# Altium footprint library MyPcbLib.PcbLib: 657 footprints (part 21 of 42)
Each footprint in its own frame and in the unit in brackets; x right, y up, seen from the top. Pads: shape width x height; smd on the part's side, far side on the other; paste and mask are expansions set on the pad; w line width, h text height; cw(c..) or ccw(c..) is an arc to the next point about the centre after c.
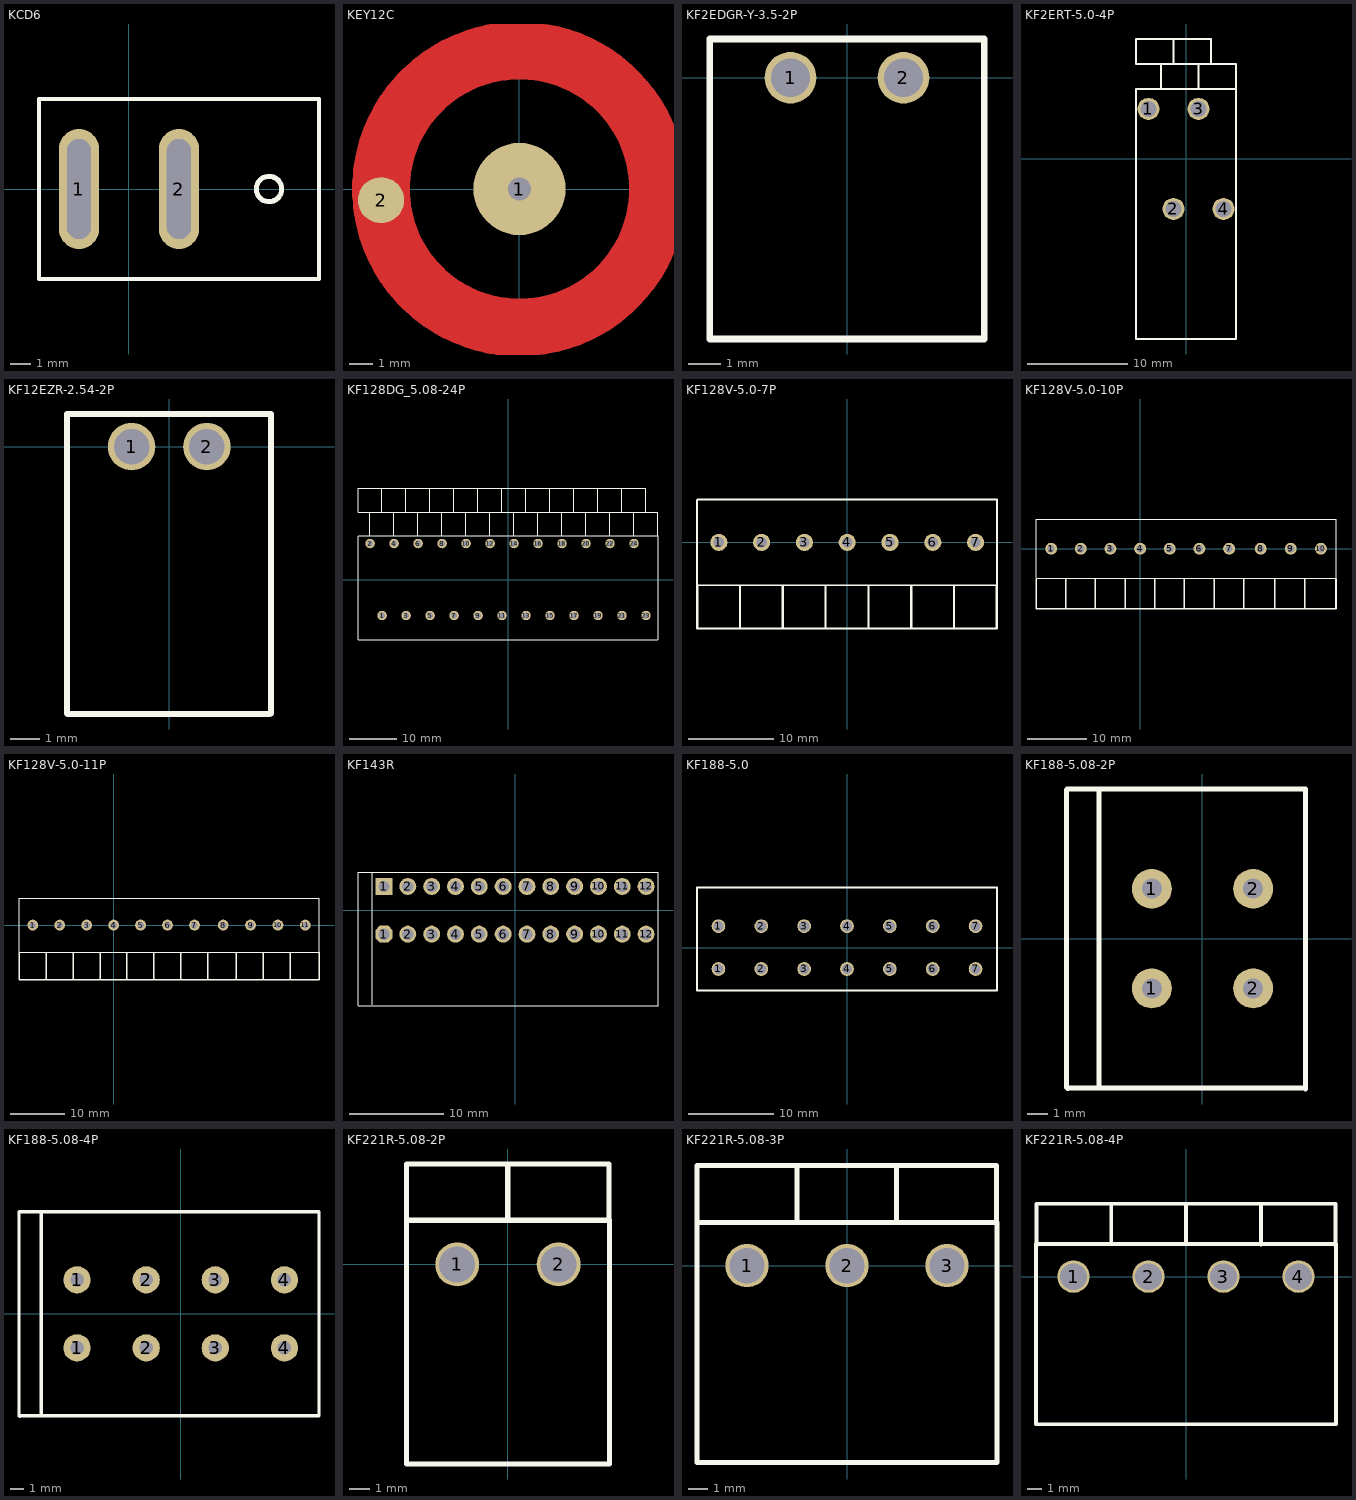
[diagram p20: the footprints below, top view; thin cyan lines are the x and y axes]

## KCD6 [mm]
pads (2):
  oval 2x6 hole 1.2 slot 5 at 90 deg: 1(-2.5,0) 2(2.5,0)
Top Overlay:
  circle w0.254: c7,0 r0.635
  lines w0.203: -4.5,-4.5 -4.5,4.5 9.5,4.5 9.5,-4.5 -4.5,-4.5

## KEY12C [mm]
pads (2):
  round 4 hole 1: 1(0,0)
  round 2 smd: 2(-5.994,-0.483)
Top Layer:
  circle w2.5: c0,0 r6
Top Solder:
  circle w2.5: c0,0 r6

## KF2EDGR-Y-3.5-2P [mm]
pads (2):
  round 1.6 hole 1.2: 1(-1.75,0) 2(1.75,0)
Top Overlay:
  lines w0.203: -4.25,1.2 -4.25,-8.1 4.25,-8.1 4.25,1.2 ; -4.242,1.2 4.216,1.2

## KF2ERT-5.0-4P [mm]
pads (4):
  round 2.2 hole 1.6: 1(-3.75,5) 2(-1.25,-5) 3(1.25,5) 4(3.75,-5)
Top Overlay:
  lines w0.203: -5.004,9.485 -5.004,11.985 ; -4.978,9.485 5,9.485 ; -4.978,11.989 2.502,11.989 ; -2.502,7.01 -2.502,9.485 ; -1.251,9.485 -1.251,11.913 ; 1.251,7.036 1.251,9.51 ; 2.502,9.485 2.502,11.887 ; 5,6.934 5,-18 -5,-18 -5,7 5,7 ; 5.004,6.934 5.004,9.485

## KF12EZR-2.54-2P [mm]
pads (2):
  round 1.6 hole 1.2: 1(-1.27,0) 2(1.27,0)
Top Overlay:
  lines w0.203: -3.454,1.092 3.404,1.092 ; -3.44,-9 -3.44,1.1 ; -3.429,-9.017 3.378,-9.017 ; 3.44,-9 3.44,1.1

## KF128DG_5.08-24P [mm]
pads (24):
  round 2 hole 1.2: 1(-26.67,-7.62) 2(-29.21,7.62) 3(-21.59,-7.62) 4(-24.13,7.62) 5(-16.51,-7.62) 6(-19.05,7.62) 7(-11.43,-7.62) 8(-13.97,7.62) 9(-6.35,-7.62) 10(-8.89,7.62) 11(-1.27,-7.62) 12(-3.81,7.62) 13(3.81,-7.62) 14(1.27,7.62) 15(8.89,-7.62) 16(6.35,7.62) 17(13.97,-7.62) 18(11.43,7.62) 19(19.05,-7.62) 20(16.51,7.62) 21(24.13,-7.62) 22(21.59,7.62) 23(29.21,-7.62) 24(26.67,7.62)
Top Overlay:
  lines w0.203: -31.775,-12.78 31.75,-12.78 ; -31.775,9.195 -31.775,-12.776 -31.75,-12.802 ; -31.775,9.22 31.75,9.22 ; -31.775,14.275 31.725,14.275 ; -31.775,14.3 -31.775,19.38 29.185,19.38 29.185,14.3 ; -29.235,9.22 -29.235,14.3 ; -26.695,14.3 -26.695,19.38 ; -24.155,9.22 -24.155,14.3 ; -21.615,14.3 -21.615,19.38 ; -19.075,9.22 -19.075,14.3 ; -16.535,14.3 -16.535,19.38 ; -13.995,9.22 -13.995,14.3 ; -11.455,14.3 -11.455,19.38 ; -8.915,9.22 -8.915,14.3 ; -6.375,14.3 -6.375,19.38 ; -3.835,9.22 -3.835,14.3 ; -1.295,14.3 -1.295,19.38 ; 1.245,9.22 1.245,14.3 ; 3.785,14.3 3.785,19.38 ; 6.325,9.22 6.325,14.3 ; 8.865,14.3 8.865,19.38 ; 11.405,9.22 11.405,14.3 ; 13.945,14.3 13.945,19.38 ; 16.485,9.22 16.485,14.3 ; 19.025,14.3 19.025,19.38 ; 21.565,9.22 21.565,14.3 ; 24.105,14.3 24.105,19.38 ; 26.645,9.22 26.645,14.3 ; 31.725,9.22 31.725,14.3 ; 31.75,-12.725 31.75,9.246
3D body: height 25.5, standoff -1.5, extent -32.522,-13.084 32.817,8.916

## KF128V-5.0-7P [mm]
pads (7):
  round 2 hole 1.2: 1(-15,0) 2(-10,0) 3(-5,0) 4(0,0) 5(5,0) 6(10,0) 7(15,0)
Top Overlay:
  lines w0.203: -17.551,-4.928 -17.551,4.953 ; -17.5,-5 17.5,-5 ; -17.5,5 17.5,5 ; 17.501,-4.953 17.501,4.953
  lines w0.254: -17.525,-5.055 -17.525,-10.055 17.475,-10.055 17.475,-5.055 ; -12.525,-10.055 -12.525,-5.055 ; -7.525,-10.055 -7.525,-5.055 ; -2.525,-10.055 -2.525,-5.055 ; 2.475,-10.055 2.475,-5.055 ; 7.475,-10.055 7.475,-5.055 ; 12.475,-10.055 12.475,-5.055
3D body: height 14.2, standoff -1.8, extent -17.653,-5.004 17.907,4.996

## KF128V-5.0-10P [mm]
pads (10):
  round 2 hole 1.2: 1(-15,0) 2(-10,0) 3(-5,0) 4(0,0) 5(5,0) 6(10,0) 7(15,0) 8(20.32,0) 9(25.4,0) 10(30.48,0)
Top Overlay:
  lines w0.203: -17.551,-4.928 -17.551,4.953 ; -17.5,-5 33.02,-5 33.02,5 -17.5,5
  lines w0.254: -17.525,-5.055 -17.525,-10.16 33.02,-10.16 ; -12.525,-10.055 -12.525,-5.055 ; -7.525,-10.055 -7.525,-5.055 ; -2.525,-10.055 -2.525,-5.055 ; 2.475,-10.055 2.475,-5.055 ; 7.475,-10.055 7.475,-5.055 ; 12.475,-10.055 12.475,-5.055 ; 17.475,-10.16 17.475,-5.055 ; 22.715,-10.055 22.715,-5.055 ; 27.715,-10.055 27.715,-5.055 ; 33.02,-10.055 33.02,-5.055
3D body: height 14.2, standoff -1.8, extent -17.653,-5.004 17.907,4.996

## KF128V-5.0-11P [mm]
pads (11):
  round 2 hole 1.2: 1(-15,0) 2(-10,0) 3(-5,0) 4(0,0) 5(5,0) 6(10,0) 7(15,0) 8(20.32,0) 9(25.4,0) 10(30.48,0) 11(35.56,0)
Top Overlay:
  lines w0.203: -17.551,-4.928 -17.551,4.953 ; -17.5,-5 38.1,-5 38.1,5 -17.5,5
  lines w0.254: -17.525,-5.055 -17.525,-10.16 38.1,-10.16 38.1,-5.055 ; -12.525,-10.055 -12.525,-5.055 ; -7.525,-10.055 -7.525,-5.055 ; -2.525,-10.055 -2.525,-5.055 ; 2.475,-10.055 2.475,-5.055 ; 7.475,-10.055 7.475,-5.055 ; 12.475,-10.055 12.475,-5.055 ; 17.475,-10.16 17.475,-5.055 ; 22.715,-10.055 22.715,-5.055 ; 27.715,-10.055 27.715,-5.055 ; 27.795,-10.055 27.795,-5.055 ; 32.795,-10.055 32.795,-5.055
3D body: height 14.2, standoff -1.8, extent -17.653,-5.004 17.907,4.996

## KF143R [mm]
pads (24):
  oct 1.8x1.8 hole 1.2 unplated: 1(-13.97,-2.54)
  rect 1.8x1.8 hole 1.2 unplated: 1(-13.97,2.54)
  round 1.8 hole 1.2 unplated: 2(-11.43,-2.54) 2(-11.43,2.54) 3(-8.89,-2.54) 3(-8.89,2.54) 4(-6.35,-2.54) 4(-6.35,2.54) 5(-3.81,-2.54) 5(-3.81,2.54) 6(-1.27,-2.54) 6(-1.27,2.54) 7(1.27,-2.54) 7(1.27,2.54) 8(3.81,-2.54) 8(3.81,2.54) 9(6.35,-2.54) 9(6.35,2.54) 10(8.89,-2.54) 10(8.89,2.54) 11(11.43,-2.54) 11(11.43,2.54) 12(13.97,-2.54) 12(13.97,2.54)
Top Overlay:
  lines w0.127: -15.24,-10.058 -15.24,4.013 ; -16.74,-10.16 15.24,-10.16 15.24,4.04 -16.74,4.04 -16.74,-10.16
3D body: height 2.3, standoff -12.9, extent -16.955,-12.388 15.025,3.912

## KF188-5.0 [mm]
pads (14):
  round 1.6 hole 1.2: 1(-15,-2.5) 1(-15,2.5) 2(-10,-2.5) 2(-10,2.5) 3(-5,-2.5) 3(-5,2.5) 4(0,-2.5) 4(0,2.5) 5(5,-2.5) 5(5,2.5) 6(10,-2.5) 6(10,2.5) 7(15,-2.5) 7(15,2.5)
Top Overlay:
  lines w0.203: -17.501,-5.004 -17.501,6.985 ; -17.5,-5 17.5,-5 ; -17.5,7 17.5,7 ; 17.501,-5.004 17.501,6.985

## KF188-5.08-2P [mm]
pads (4):
  round 2 hole 1: 1(-2.54,-2.5) 1(-2.54,2.5) 2(2.54,-2.5) 2(2.54,2.5)
Top Overlay:
  lines w0.254: -6.807,7.442 -6.807,-7.468 -6.756,-7.518 ; -6.78,-7.5 5.08,-7.5 ; -6.78,7.5 5.08,7.5 ; -5.182,7.493 -5.182,-7.417 -5.105,-7.493 ; 5.156,-7.544 5.156,7.493

## KF188-5.08-4P [mm]
pads (8):
  round 2 hole 1: 1(-7.62,-2.5) 1(-7.62,2.5) 2(-2.54,-2.5) 2(-2.54,2.5) 3(2.54,-2.5) 3(2.54,2.5) 4(7.62,-2.5) 4(7.62,2.5)
Top Overlay:
  lines w0.254: -11.887,7.442 -11.887,-7.468 -11.836,-7.518 ; -11.86,-7.5 10.16,-7.5 10.16,7.5 -11.86,7.5 ; -10.262,7.493 -10.262,-7.417 -10.185,-7.493

## KF221R-5.08-2P [mm]
pads (2):
  round 2.2 hole 1.8: 1(-2.54,0) 2(2.54,0)
Top Overlay:
  lines w0.254: -5.08,-10 5.08,-10 5.08,2.2 -5.08,2.2 -5.08,-9.968 ; -5.08,2.21 -5.08,5.029 5.063,5.029 5.063,2.311 ; -5.055,2.225 5.088,2.225 ; -0.008,2.286 -0.008,5.029

## KF221R-5.08-3P [mm]
pads (3):
  round 2.2 hole 1.8: 1(-5.08,0) 2(0,0) 3(5.08,0)
Top Overlay:
  lines w0.254: -7.62,-10 7.62,-10 7.62,2.2 -7.62,2.2 -7.62,-9.968 ; -7.62,2.261 -7.62,5.08 7.569,5.08 ; -2.548,2.337 -2.548,5.08 ; 2.523,2.362 2.523,5.08 ; 7.595,2.311 7.595,5.08

## KF221R-5.08-4P [mm]
pads (4):
  round 2.2 hole 1.8: 1(-7.62,0) 2(-2.54,0) 3(2.54,0) 4(7.62,0)
Top Overlay:
  lines w0.254: -10.16,-10 10.16,-10 ; -10.16,-9.968 -10.16,2.2 10.16,2.2 ; -10.135,2.108 -10.135,4.928 10.135,4.928 10.135,2.108 ; -5.063,2.184 -5.063,4.928 ; 0.008,2.21 0.008,4.928 ; 5.08,2.159 5.08,4.928 ; 10.16,-9.975 10.16,2.225